# Altium footprint library SMD IC Packages.PcbLib: 345 footprints (part 26 of 36) (continued)
## PG411 [mm] "411-Pin Ceramic Pin Grid Array (PG411)" (continued)
Top Overlay:
  circle w0.25: c-27.1,24.13 r0.125
  lines w0.2: -26.45,-26.45 -26.45,25.45 -25.45,26.45 26.45,26.45 26.45,-26.45 -26.45,-26.45

## PG475 [mm] "475-Pin Ceramic Pin Grid Array (PG475)"
height 5.86
pads (475):
  round 1.5 hole 0.9: A3(-22.86,25.4) A5(-20.32,25.4) A7(-17.78,25.4) A9(-15.24,25.4) A11(-12.7,25.4) A13(-10.16,25.4) A15(-7.62,25.4) A17(-5.08,25.4) A19(-2.54,25.4) A21(0,25.4) A23(2.54,25.4) A25(5.08,25.4) A27(7.62,25.4) A29(10.16,25.4) A31(12.7,25.4) A33(15.24,25.4) A35(17.78,25.4) A37(20.32,25.4) A39(22.86,25.4) A41(25.4,25.4) AA1(-25.4,0) AA3(-22.86,0) AA5(-20.32,0) AA7(-17.78,0) AA35(17.78,0) AA37(20.32,0) AA39(22.86,0) AA41(25.4,0) AB2(-24.13,-1.27) AB4(-21.59,-1.27) AB6(-19.05,-1.27) AB36(19.05,-1.27) AB38(21.59,-1.27) AB40(24.13,-1.27) AC1(-25.4,-2.54) AC3(-22.86,-2.54) AC5(-20.32,-2.54) AC7(-17.78,-2.54) AC35(17.78,-2.54) AC37(20.32,-2.54) AC39(22.86,-2.54) AC41(25.4,-2.54) AD2(-24.13,-3.81) AD4(-21.59,-3.81) AD6(-19.05,-3.81) AD36(19.05,-3.81) AD38(21.59,-3.81) AD40(24.13,-3.81) AE1(-25.4,-5.08) AE3(-22.86,-5.08) AE5(-20.32,-5.08) AE7(-17.78,-5.08) AE35(17.78,-5.08) AE37(20.32,-5.08) AE39(22.86,-5.08) AE41(25.4,-5.08) AF2(-24.13,-6.35) AF4(-21.59,-6.35) AF6(-19.05,-6.35) AF36(19.05,-6.35) AF38(21.59,-6.35) AF40(24.13,-6.35) AG1(-25.4,-7.62) AG3(-22.86,-7.62) AG5(-20.32,-7.62) AG7(-17.78,-7.62) AG35(17.78,-7.62) AG37(20.32,-7.62) AG39(22.86,-7.62) AG41(25.4,-7.62) AH2(-24.13,-8.89) AH4(-21.59,-8.89) AH6(-19.05,-8.89) AH36(19.05,-8.89) AH38(21.59,-8.89) AH40(24.13,-8.89) AJ1(-25.4,-10.16) AJ3(-22.86,-10.16) AJ5(-20.32,-10.16) AJ7(-17.78,-10.16) AJ35(17.78,-10.16) AJ37(20.32,-10.16) AJ39(22.86,-10.16) AJ41(25.4,-10.16) AK2(-24.13,-11.43) AK4(-21.59,-11.43) AK6(-19.05,-11.43) AK36(19.05,-11.43) AK38(21.59,-11.43) AK40(24.13,-11.43) AL1(-25.4,-12.7) AL3(-22.86,-12.7) AL5(-20.32,-12.7) AL7(-17.78,-12.7) AL35(17.78,-12.7) AL37(20.32,-12.7) AL39(22.86,-12.7) AL41(25.4,-12.7) AM2(-24.13,-13.97) AM4(-21.59,-13.97) AM6(-19.05,-13.97) AM36(19.05,-13.97) AM38(21.59,-13.97) AM40(24.13,-13.97) AN1(-25.4,-15.24) AN3(-22.86,-15.24) AN5(-20.32,-15.24) AN7(-17.78,-15.24) AN35(17.78,-15.24) AN37(20.32,-15.24) AN39(22.86,-15.24) AN41(25.4,-15.24) AP2(-24.13,-16.51) AP4(-21.59,-16.51) AP6(-19.05,-16.51) AP36(19.05,-16.51) AP38(21.59,-16.51) AP40(24.13,-16.51) AR1(-25.4,-17.78) AR3(-22.86,-17.78) AR5(-20.32,-17.78) AR7(-17.78,-17.78) AR9(-15.24,-17.78) AR11(-12.7,-17.78) AR13(-10.16,-17.78) AR15(-7.62,-17.78) AR17(-5.08,-17.78) AR19(-2.54,-17.78) AR21(0,-17.78) AR23(2.54,-17.78) AR25(5.08,-17.78) AR27(7.62,-17.78) AR29(10.16,-17.78) AR31(12.7,-17.78) AR33(15.24,-17.78) AR35(17.78,-17.78) AR37(20.32,-17.78) AR39(22.86,-17.78) AR41(25.4,-17.78) AT2(-24.13,-19.05) AT4(-21.59,-19.05) AT6(-19.05,-19.05) AT8(-16.51,-19.05) AT10(-13.97,-19.05) AT12(-11.43,-19.05) AT14(-8.89,-19.05) AT16(-6.35,-19.05) AT18(-3.81,-19.05) AT20(-1.27,-19.05) AT22(1.27,-19.05) AT24(3.81,-19.05) AT26(6.35,-19.05) AT28(8.89,-19.05) AT30(11.43,-19.05) AT32(13.97,-19.05) AT34(16.51,-19.05) AT36(19.05,-19.05) AT38(21.59,-19.05) AT40(24.13,-19.05) AU1(-25.4,-20.32) AU3(-22.86,-20.32) AU5(-20.32,-20.32) AU7(-17.78,-20.32) AU9(-15.24,-20.32) AU11(-12.7,-20.32) AU13(-10.16,-20.32) AU15(-7.62,-20.32) AU17(-5.08,-20.32) AU19(-2.54,-20.32) AU21(0,-20.32) AU23(2.54,-20.32) AU25(5.08,-20.32) AU27(7.62,-20.32) AU29(10.16,-20.32) AU31(12.7,-20.32) AU33(15.24,-20.32) AU35(17.78,-20.32) AU37(20.32,-20.32) AU39(22.86,-20.32) AU41(25.4,-20.32) AV2(-24.13,-21.59) AV4(-21.59,-21.59) AV6(-19.05,-21.59) AV8(-16.51,-21.59) AV10(-13.97,-21.59) AV12(-11.43,-21.59) AV14(-8.89,-21.59) AV16(-6.35,-21.59) AV18(-3.81,-21.59) AV20(-1.27,-21.59) AV22(1.27,-21.59) AV24(3.81,-21.59) AV26(6.35,-21.59) AV28(8.89,-21.59) AV30(11.43,-21.59) AV32(13.97,-21.59) AV34(16.51,-21.59) AV36(19.05,-21.59) AV38(21.59,-21.59) AV40(24.13,-21.59) AW1(-25.4,-22.86) AW3(-22.86,-22.86) AW5(-20.32,-22.86) AW7(-17.78,-22.86) AW9(-15.24,-22.86) AW11(-12.7,-22.86) AW13(-10.16,-22.86) AW15(-7.62,-22.86) AW17(-5.08,-22.86) AW19(-2.54,-22.86) AW21(0,-22.86) AW23(2.54,-22.86) AW25(5.08,-22.86) AW27(7.62,-22.86) AW29(10.16,-22.86) AW31(12.7,-22.86) AW33(15.24,-22.86) AW35(17.78,-22.86) AW37(20.32,-22.86) AW39(22.86,-22.86) AW41(25.4,-22.86) AY2(-24.13,-24.13) AY4(-21.59,-24.13) AY6(-19.05,-24.13) AY8(-16.51,-24.13) AY10(-13.97,-24.13) AY12(-11.43,-24.13) AY14(-8.89,-24.13) AY16(-6.35,-24.13) AY18(-3.81,-24.13) AY20(-1.27,-24.13) AY22(1.27,-24.13) AY24(3.81,-24.13) AY26(6.35,-24.13) AY28(8.89,-24.13) AY30(11.43,-24.13) AY32(13.97,-24.13) AY34(16.51,-24.13) AY36(19.05,-24.13) AY38(21.59,-24.13) AY40(24.13,-24.13) B2(-24.13,24.13) B4(-21.59,24.13) B6(-19.05,24.13) B8(-16.51,24.13) B10(-13.97,24.13) B12(-11.43,24.13) B14(-8.89,24.13) B16(-6.35,24.13) B18(-3.81,24.13) B20(-1.27,24.13) B22(1.27,24.13) B24(3.81,24.13) B26(6.35,24.13) B28(8.89,24.13) B30(11.43,24.13) B32(13.97,24.13) B34(16.51,24.13) B36(19.05,24.13) B38(21.59,24.13) B40(24.13,24.13) BA1(-25.4,-25.4) BA3(-22.86,-25.4) BA5(-20.32,-25.4) BA7(-17.78,-25.4) BA9(-15.24,-25.4) BA11(-12.7,-25.4) BA13(-10.16,-25.4) BA15(-7.62,-25.4) BA17(-5.08,-25.4) BA19(-2.54,-25.4) BA21(0,-25.4) BA23(2.54,-25.4) BA25(5.08,-25.4) BA27(7.62,-25.4) BA29(10.16,-25.4) BA31(12.7,-25.4) BA33(15.24,-25.4) BA35(17.78,-25.4) BA37(20.32,-25.4) BA39(22.86,-25.4) BA41(25.4,-25.4) C1(-25.4,22.86) C3(-22.86,22.86) C5(-20.32,22.86) C7(-17.78,22.86) C9(-15.24,22.86) C11(-12.7,22.86) C13(-10.16,22.86) C15(-7.62,22.86) C17(-5.08,22.86) C19(-2.54,22.86) C21(0,22.86) C23(2.54,22.86) C25(5.08,22.86) C27(7.62,22.86) C29(10.16,22.86) C31(12.7,22.86) C33(15.24,22.86) C35(17.78,22.86) C37(20.32,22.86) C39(22.86,22.86) C41(25.4,22.86) D2(-24.13,21.59) D4(-21.59,21.59) D6(-19.05,21.59) D8(-16.51,21.59) D10(-13.97,21.59) D12(-11.43,21.59) D14(-8.89,21.59) D16(-6.35,21.59) D18(-3.81,21.59) D20(-1.27,21.59) D22(1.27,21.59) D24(3.81,21.59) D26(6.35,21.59) D28(8.89,21.59) D30(11.43,21.59) D32(13.97,21.59) D34(16.51,21.59) D36(19.05,21.59) D38(21.59,21.59) D40(24.13,21.59) E1(-25.4,20.32) E3(-22.86,20.32) E5(-20.32,20.32) E7(-17.78,20.32) E9(-15.24,20.32) E11(-12.7,20.32) E13(-10.16,20.32) E15(-7.62,20.32) E17(-5.08,20.32) E19(-2.54,20.32) E21(0,20.32) E23(2.54,20.32) E25(5.08,20.32) E27(7.62,20.32) E29(10.16,20.32) E31(12.7,20.32) E33(15.24,20.32) E35(17.78,20.32) E37(20.32,20.32) E39(22.86,20.32) E41(25.4,20.32) F2(-24.13,19.05) F4(-21.59,19.05) F6(-19.05,19.05) F8(-16.51,19.05) F10(-13.97,19.05) F12(-11.43,19.05) F14(-8.89,19.05) F16(-6.35,19.05) F18(-3.81,19.05) F20(-1.27,19.05) F22(1.27,19.05) F24(3.81,19.05) F26(6.35,19.05) F28(8.89,19.05) F30(11.43,19.05) F32(13.97,19.05) F34(16.51,19.05) F36(19.05,19.05) F38(21.59,19.05) F40(24.13,19.05) G1(-25.4,17.78) G3(-22.86,17.78) G5(-20.32,17.78) G7(-17.78,17.78) G9(-15.24,17.78) G11(-12.7,17.78) G13(-10.16,17.78) G15(-7.62,17.78) G17(-5.08,17.78) G19(-2.54,17.78) G21(0,17.78) G23(2.54,17.78) G25(5.08,17.78) G27(7.62,17.78) G29(10.16,17.78) G31(12.7,17.78) G33(15.24,17.78) G35(17.78,17.78) G37(20.32,17.78) G39(22.86,17.78) G41(25.4,17.78) H2(-24.13,16.51) H4(-21.59,16.51) H6(-19.05,16.51) H36(19.05,16.51) H38(21.59,16.51) H40(24.13,16.51) J1(-25.4,15.24) J3(-22.86,15.24) J5(-20.32,15.24) J7(-17.78,15.24) J35(17.78,15.24) J37(20.32,15.24) J39(22.86,15.24) J41(25.4,15.24) K2(-24.13,13.97) K4(-21.59,13.97) K6(-19.05,13.97) K36(19.05,13.97) K38(21.59,13.97) K40(24.13,13.97) L1(-25.4,12.7) L3(-22.86,12.7) L5(-20.32,12.7) L7(-17.78,12.7) L35(17.78,12.7) L37(20.32,12.7) L39(22.86,12.7) L41(25.4,12.7) M2(-24.13,11.43) M4(-21.59,11.43) M6(-19.05,11.43) M36(19.05,11.43) M38(21.59,11.43) M40(24.13,11.43) N1(-25.4,10.16) N3(-22.86,10.16) N5(-20.32,10.16) N7(-17.78,10.16) N35(17.78,10.16) N37(20.32,10.16) N39(22.86,10.16) N41(25.4,10.16) P2(-24.13,8.89) P4(-21.59,8.89) P6(-19.05,8.89) P36(19.05,8.89) P38(21.59,8.89) P40(24.13,8.89) R1(-25.4,7.62) R3(-22.86,7.62) R5(-20.32,7.62) R7(-17.78,7.62) R35(17.78,7.62) R37(20.32,7.62) R39(22.86,7.62) R41(25.4,7.62) T2(-24.13,6.35) T4(-21.59,6.35) T6(-19.05,6.35) T36(19.05,6.35) T38(21.59,6.35) T40(24.13,6.35) U1(-25.4,5.08) U3(-22.86,5.08) U5(-20.32,5.08) U7(-17.78,5.08) U35(17.78,5.08) U37(20.32,5.08) U39(22.86,5.08) U41(25.4,5.08) V2(-24.13,3.81) V4(-21.59,3.81) V6(-19.05,3.81) V36(19.05,3.81) V38(21.59,3.81) V40(24.13,3.81) W1(-25.4,2.54) W3(-22.86,2.54) W5(-20.32,2.54) W7(-17.78,2.54) W35(17.78,2.54) W37(20.32,2.54) W39(22.86,2.54) W41(25.4,2.54) Y2(-24.13,1.27) Y4(-21.59,1.27) Y6(-19.05,1.27) Y36(19.05,1.27) Y38(21.59,1.27) Y40(24.13,1.27)
Top Overlay:
  circle w0.25: c-28.35,25.4 r0.125
  lines w0.2: -27.7,-27.7 27.7,-27.7 27.7,27.7 -26.7,27.7 -27.7,26.7 -27.7,-27.7

## PG559 [mm] "559-Pin Ceramic Pin Grid Array (PG559)"
height 5.86
pads (559):
  round 1.5 hole 0.9: A3(-24.13,26.67) A5(-21.59,26.67) A7(-19.05,26.67) A9(-16.51,26.67) A11(-13.97,26.67) A13(-11.43,26.67) A15(-8.89,26.67) A17(-6.35,26.67) A19(-3.81,26.67) A21(-1.27,26.67) A23(1.27,26.67) A25(3.81,26.67) A27(6.35,26.67) A29(8.89,26.67) A31(11.43,26.67) A33(13.97,26.67) A35(16.51,26.67) A37(19.05,26.67) A39(21.59,26.67) A41(24.13,26.67) A43(26.67,26.67) AA1(-26.67,1.27) AA3(-24.13,1.27) AA5(-21.59,1.27) AA7(-19.05,1.27) AA37(19.05,1.27) AA39(21.59,1.27) AA41(24.13,1.27) AA43(26.67,1.27) AB2(-25.4,0) AB4(-22.86,0) AB6(-20.32,0) AB8(-17.78,0) AB36(17.78,0) AB38(20.32,0) AB40(22.86,0) AB42(25.4,0) AC1(-26.67,-1.27) AC3(-24.13,-1.27) AC5(-21.59,-1.27) AC7(-19.05,-1.27) AC37(19.05,-1.27) AC39(21.59,-1.27) AC41(24.13,-1.27) AC43(26.67,-1.27) AD2(-25.4,-2.54) AD4(-22.86,-2.54) AD6(-20.32,-2.54) AD8(-17.78,-2.54) AD36(17.78,-2.54) AD38(20.32,-2.54) AD40(22.86,-2.54) AD42(25.4,-2.54) AE1(-26.67,-3.81) AE3(-24.13,-3.81) AE5(-21.59,-3.81) AE7(-19.05,-3.81) AE37(19.05,-3.81) AE39(21.59,-3.81) AE41(24.13,-3.81) AE43(26.67,-3.81) AF2(-25.4,-5.08) AF4(-22.86,-5.08) AF6(-20.32,-5.08) AF8(-17.78,-5.08) AF36(17.78,-5.08) AF38(20.32,-5.08) AF40(22.86,-5.08) AF42(25.4,-5.08) AG1(-26.67,-6.35) AG3(-24.13,-6.35) AG5(-21.59,-6.35) AG7(-19.05,-6.35) AG37(19.05,-6.35) AG39(21.59,-6.35) AG41(24.13,-6.35) AG43(26.67,-6.35) AH2(-25.4,-7.62) AH4(-22.86,-7.62) AH6(-20.32,-7.62) AH8(-17.78,-7.62) AH36(17.78,-7.62) AH38(20.32,-7.62) AH40(22.86,-7.62) AH42(25.4,-7.62) AJ1(-26.67,-8.89) AJ3(-24.13,-8.89) AJ5(-21.59,-8.89) AJ7(-19.05,-8.89) AJ37(19.05,-8.89) AJ39(21.59,-8.89) AJ41(24.13,-8.89) AJ43(26.67,-8.89) AK2(-25.4,-10.16) AK4(-22.86,-10.16) AK6(-20.32,-10.16) AK8(-17.78,-10.16) AK36(17.78,-10.16) AK38(20.32,-10.16) AK40(22.86,-10.16) AK42(25.4,-10.16) AL1(-26.67,-11.43) AL3(-24.13,-11.43) AL5(-21.59,-11.43) AL7(-19.05,-11.43) AL37(19.05,-11.43) AL39(21.59,-11.43) AL41(24.13,-11.43) AL43(26.67,-11.43) AM2(-25.4,-12.7) AM4(-22.86,-12.7) AM6(-20.32,-12.7) AM8(-17.78,-12.7) AM36(17.78,-12.7) AM38(20.32,-12.7) AM40(22.86,-12.7) AM42(25.4,-12.7) AN1(-26.67,-13.97) AN3(-24.13,-13.97) AN5(-21.59,-13.97) AN7(-19.05,-13.97) AN37(19.05,-13.97) AN39(21.59,-13.97) AN41(24.13,-13.97) AN43(26.67,-13.97) AP2(-25.4,-15.24) AP4(-22.86,-15.24) AP6(-20.32,-15.24) AP8(-17.78,-15.24) AP36(17.78,-15.24) AP38(20.32,-15.24) AP40(22.86,-15.24) AP42(25.4,-15.24) AR1(-26.67,-16.51) AR3(-24.13,-16.51) AR5(-21.59,-16.51) AR7(-19.05,-16.51) AR37(19.05,-16.51) AR39(21.59,-16.51) AR41(24.13,-16.51) AR43(26.67,-16.51) AT2(-25.4,-17.78) AT4(-22.86,-17.78) AT6(-20.32,-17.78) AT8(-17.78,-17.78) AT10(-15.24,-17.78) AT12(-12.7,-17.78) AT14(-10.16,-17.78) AT16(-7.62,-17.78) AT18(-5.08,-17.78) AT20(-2.54,-17.78) AT22(0,-17.78) AT24(2.54,-17.78) AT26(5.08,-17.78) AT28(7.62,-17.78) AT30(10.16,-17.78) AT32(12.7,-17.78) AT34(15.24,-17.78) AT36(17.78,-17.78) AT38(20.32,-17.78) AT40(22.86,-17.78) AT42(25.4,-17.78) AU1(-26.67,-19.05) AU3(-24.13,-19.05) AU5(-21.59,-19.05) AU7(-19.05,-19.05) AU9(-16.51,-19.05) AU11(-13.97,-19.05) AU13(-11.43,-19.05) AU15(-8.89,-19.05) AU17(-6.35,-19.05) AU19(-3.81,-19.05) AU21(-1.27,-19.05) AU23(1.27,-19.05) AU25(3.81,-19.05) AU27(6.35,-19.05) AU29(8.89,-19.05) AU31(11.43,-19.05) AU33(13.97,-19.05) AU35(16.51,-19.05) AU37(19.05,-19.05) AU39(21.59,-19.05) AU41(24.13,-19.05) AU43(26.67,-19.05) AV2(-25.4,-20.32) AV4(-22.86,-20.32) AV6(-20.32,-20.32) AV8(-17.78,-20.32) AV10(-15.24,-20.32) AV12(-12.7,-20.32) AV14(-10.16,-20.32) AV16(-7.62,-20.32) AV18(-5.08,-20.32) AV20(-2.54,-20.32) AV22(0,-20.32) AV24(2.54,-20.32) AV26(5.08,-20.32) AV28(7.62,-20.32) AV30(10.16,-20.32) AV32(12.7,-20.32) AV34(15.24,-20.32) AV36(17.78,-20.32) AV38(20.32,-20.32) AV40(22.86,-20.32) AV42(25.4,-20.32) AW1(-26.67,-21.59) AW3(-24.13,-21.59) AW5(-21.59,-21.59) AW7(-19.05,-21.59) AW9(-16.51,-21.59) AW11(-13.97,-21.59) AW13(-11.43,-21.59) AW15(-8.89,-21.59) AW17(-6.35,-21.59) AW19(-3.81,-21.59) AW21(-1.27,-21.59) AW23(1.27,-21.59) AW25(3.81,-21.59) AW27(6.35,-21.59) AW29(8.89,-21.59) AW31(11.43,-21.59) AW33(13.97,-21.59) AW35(16.51,-21.59) AW37(19.05,-21.59) AW39(21.59,-21.59) AW41(24.13,-21.59) AW43(26.67,-21.59) AY2(-25.4,-22.86) AY4(-22.86,-22.86) AY6(-20.32,-22.86) AY8(-17.78,-22.86) AY10(-15.24,-22.86) AY12(-12.7,-22.86) AY14(-10.16,-22.86) AY16(-7.62,-22.86) AY18(-5.08,-22.86) AY20(-2.54,-22.86) AY22(0,-22.86) AY24(2.54,-22.86) AY26(5.08,-22.86) AY28(7.62,-22.86) AY30(10.16,-22.86) AY32(12.7,-22.86) AY34(15.24,-22.86) AY36(17.78,-22.86) AY38(20.32,-22.86) AY40(22.86,-22.86) AY42(25.4,-22.86) B2(-25.4,25.4) B4(-22.86,25.4) B6(-20.32,25.4) B8(-17.78,25.4) B10(-15.24,25.4) B12(-12.7,25.4) B14(-10.16,25.4) B16(-7.62,25.4) B18(-5.08,25.4) B20(-2.54,25.4) B22(0,25.4) B24(2.54,25.4) B26(5.08,25.4) B28(7.62,25.4) B30(10.16,25.4) B32(12.7,25.4) B34(15.24,25.4) B36(17.78,25.4) B38(20.32,25.4) B40(22.86,25.4) B42(25.4,25.4) BA1(-26.67,-24.13) BA3(-24.13,-24.13) BA5(-21.59,-24.13) BA7(-19.05,-24.13) BA9(-16.51,-24.13) BA11(-13.97,-24.13) BA13(-11.43,-24.13) BA15(-8.89,-24.13) BA17(-6.35,-24.13) BA19(-3.81,-24.13) BA21(-1.27,-24.13) BA23(1.27,-24.13) BA25(3.81,-24.13) BA27(6.35,-24.13) BA29(8.89,-24.13) BA31(11.43,-24.13) BA33(13.97,-24.13) BA35(16.51,-24.13) BA37(19.05,-24.13) BA39(21.59,-24.13) BA41(24.13,-24.13) BA43(26.67,-24.13) BB2(-25.4,-25.4) BB4(-22.86,-25.4) BB6(-20.32,-25.4) BB8(-17.78,-25.4) BB10(-15.24,-25.4) BB12(-12.7,-25.4) BB14(-10.16,-25.4) BB16(-7.62,-25.4) BB18(-5.08,-25.4) BB20(-2.54,-25.4) BB22(0,-25.4) BB24(2.54,-25.4) BB26(5.08,-25.4) BB28(7.62,-25.4) BB30(10.16,-25.4) BB32(12.7,-25.4) BB34(15.24,-25.4) BB36(17.78,-25.4) BB38(20.32,-25.4) BB40(22.86,-25.4) BB42(25.4,-25.4) BC1(-26.67,-26.67) BC3(-24.13,-26.67) BC5(-21.59,-26.67) BC7(-19.05,-26.67) BC9(-16.51,-26.67) BC11(-13.97,-26.67) BC13(-11.43,-26.67) BC15(-8.89,-26.67) BC17(-6.35,-26.67) BC19(-3.81,-26.67) BC21(-1.27,-26.67) BC23(1.27,-26.67) BC25(3.81,-26.67) BC27(6.35,-26.67) BC29(8.89,-26.67) BC31(11.43,-26.67) BC33(13.97,-26.67) BC35(16.51,-26.67) BC37(19.05,-26.67) BC39(21.59,-26.67) BC41(24.13,-26.67) BC43(26.67,-26.67) C1(-26.67,24.13) C3(-24.13,24.13) C5(-21.59,24.13) C7(-19.05,24.13) C9(-16.51,24.13) C11(-13.97,24.13) C13(-11.43,24.13) C15(-8.89,24.13) C17(-6.35,24.13) C19(-3.81,24.13) C21(-1.27,24.13) C23(1.27,24.13) C25(3.81,24.13) C27(6.35,24.13) C29(8.89,24.13) C31(11.43,24.13) C33(13.97,24.13) C35(16.51,24.13) C37(19.05,24.13) C39(21.59,24.13) C41(24.13,24.13) C43(26.67,24.13) D2(-25.4,22.86) D4(-22.86,22.86) D6(-20.32,22.86) D8(-17.78,22.86) D10(-15.24,22.86) D12(-12.7,22.86) D14(-10.16,22.86) D16(-7.62,22.86) D18(-5.08,22.86) D20(-2.54,22.86) D22(0,22.86) D24(2.54,22.86) D26(5.08,22.86) D28(7.62,22.86) D30(10.16,22.86) D32(12.7,22.86) D34(15.24,22.86) D36(17.78,22.86) D38(20.32,22.86) D40(22.86,22.86) D42(25.4,22.86) E1(-26.67,21.59) E3(-24.13,21.59) E5(-21.59,21.59) E7(-19.05,21.59) E9(-16.51,21.59) E11(-13.97,21.59) E13(-11.43,21.59) E15(-8.89,21.59) E17(-6.35,21.59) E19(-3.81,21.59) E21(-1.27,21.59) E23(1.27,21.59) E25(3.81,21.59) E27(6.35,21.59) E29(8.89,21.59) E31(11.43,21.59) E33(13.97,21.59) E35(16.51,21.59) E37(19.05,21.59) E39(21.59,21.59) E41(24.13,21.59) E43(26.67,21.59) F2(-25.4,20.32) F4(-22.86,20.32) F6(-20.32,20.32) F8(-17.78,20.32) F10(-15.24,20.32) F12(-12.7,20.32) F14(-10.16,20.32) F16(-7.62,20.32) F18(-5.08,20.32) F20(-2.54,20.32) F22(0,20.32) F24(2.54,20.32) F26(5.08,20.32) F28(7.62,20.32) F30(10.16,20.32) F32(12.7,20.32) F34(15.24,20.32) F36(17.78,20.32) F38(20.32,20.32) F40(22.86,20.32) F42(25.4,20.32) G1(-26.67,19.05) G3(-24.13,19.05) G5(-21.59,19.05) G7(-19.05,19.05) G9(-16.51,19.05) G11(-13.97,19.05) G13(-11.43,19.05) G15(-8.89,19.05) G17(-6.35,19.05) G19(-3.81,19.05) G21(-1.27,19.05) G23(1.27,19.05) G25(3.81,19.05) G27(6.35,19.05) G29(8.89,19.05) G31(11.43,19.05) G33(13.97,19.05) G35(16.51,19.05) G37(19.05,19.05) G39(21.59,19.05) G41(24.13,19.05) G43(26.67,19.05) H2(-25.4,17.78) H4(-22.86,17.78) H6(-20.32,17.78) H8(-17.78,17.78) H10(-15.24,17.78) H12(-12.7,17.78) H14(-10.16,17.78) H16(-7.62,17.78) H18(-5.08,17.78) H20(-2.54,17.78) H22(0,17.78) H24(2.54,17.78) H26(5.08,17.78) H28(7.62,17.78) H30(10.16,17.78) H32(12.7,17.78) H34(15.24,17.78) H36(17.78,17.78) H38(20.32,17.78) H40(22.86,17.78) H42(25.4,17.78) J1(-26.67,16.51) J3(-24.13,16.51) J5(-21.59,16.51) J7(-19.05,16.51) J37(19.05,16.51) J39(21.59,16.51) J41(24.13,16.51) J43(26.67,16.51) K2(-25.4,15.24) K4(-22.86,15.24) K6(-20.32,15.24) K8(-17.78,15.24) K36(17.78,15.24) K38(20.32,15.24) K40(22.86,15.24) K42(25.4,15.24) L1(-26.67,13.97) L3(-24.13,13.97) L5(-21.59,13.97) L7(-19.05,13.97) L37(19.05,13.97) L39(21.59,13.97) L41(24.13,13.97) L43(26.67,13.97) M2(-25.4,12.7) M4(-22.86,12.7) M6(-20.32,12.7) M8(-17.78,12.7) M36(17.78,12.7) M38(20.32,12.7) M40(22.86,12.7) M42(25.4,12.7) N1(-26.67,11.43) N3(-24.13,11.43) N5(-21.59,11.43) N7(-19.05,11.43) N37(19.05,11.43) N39(21.59,11.43) N41(24.13,11.43) N43(26.67,11.43) P2(-25.4,10.16) P4(-22.86,10.16) P6(-20.32,10.16) P8(-17.78,10.16) P36(17.78,10.16) P38(20.32,10.16) P40(22.86,10.16) P42(25.4,10.16) R1(-26.67,8.89) R3(-24.13,8.89) R5(-21.59,8.89) R7(-19.05,8.89) R37(19.05,8.89) R39(21.59,8.89) R41(24.13,8.89) R43(26.67,8.89) T2(-25.4,7.62) T4(-22.86,7.62) T6(-20.32,7.62) T8(-17.78,7.62) T36(17.78,7.62) T38(20.32,7.62) T40(22.86,7.62) T42(25.4,7.62) U1(-26.67,6.35) U3(-24.13,6.35) U5(-21.59,6.35) U7(-19.05,6.35) U37(19.05,6.35) U39(21.59,6.35) U41(24.13,6.35) U43(26.67,6.35) V2(-25.4,5.08) V4(-22.86,5.08) V6(-20.32,5.08) V8(-17.78,5.08) V36(17.78,5.08) V38(20.32,5.08) V40(22.86,5.08) V42(25.4,5.08) W1(-26.67,3.81) W3(-24.13,3.81) W5(-21.59,3.81) W7(-19.05,3.81) W37(19.05,3.81) W39(21.59,3.81) W41(24.13,3.81) W43(26.67,3.81) Y2(-25.4,2.54) Y4(-22.86,2.54) Y6(-20.32,2.54) Y8(-17.78,2.54) Y36(17.78,2.54) Y38(20.32,2.54) Y40(22.86,2.54) Y42(25.4,2.54)
Top Overlay:
  circle w0.25: c-29.65,26.67 r0.125
  lines w0.2: -29,-29 -29,28 -28,29 29,29 29,-29 -29,-29

## PP132 [mm] "132-Pin Plastic Pin Grid Array (PP132)"
height 4.191
pads (132):
  rect 1.5x1.5 hole 0.9: A1(-16.51,16.51)
  round 1.5 hole 0.9: A2(-13.97,16.51) A3(-11.43,16.51) A4(-8.89,16.51) A5(-6.35,16.51) A6(-3.81,16.51) A7(-1.27,16.51) A8(1.27,16.51) A9(3.81,16.51) A10(6.35,16.51) A11(8.89,16.51) A12(11.43,16.51) A13(13.97,16.51) A14(16.51,16.51) B1(-16.51,13.97) B2(-13.97,13.97) B3(-11.43,13.97) B4(-8.89,13.97) B5(-6.35,13.97) B6(-3.81,13.97) B7(-1.27,13.97) B8(1.27,13.97) B9(3.81,13.97) B10(6.35,13.97) B11(8.89,13.97) B12(11.43,13.97) B13(13.97,13.97) B14(16.51,13.97) C1(-16.51,11.43) C2(-13.97,11.43) C3(-11.43,11.43) C4(-8.89,11.43) C5(-6.35,11.43) C6(-3.81,11.43) C7(-1.27,11.43) C8(1.27,11.43) C9(3.81,11.43) C10(6.35,11.43) C11(8.89,11.43) C12(11.43,11.43) C13(13.97,11.43) C14(16.51,11.43) D1(-16.51,8.89) D2(-13.97,8.89) D3(-11.43,8.89) D12(11.43,8.89) D13(13.97,8.89) D14(16.51,8.89) E1(-16.51,6.35) E2(-13.97,6.35) E3(-11.43,6.35) E12(11.43,6.35) E13(13.97,6.35) E14(16.51,6.35) F1(-16.51,3.81) F2(-13.97,3.81) F3(-11.43,3.81) F12(11.43,3.81) F13(13.97,3.81) F14(16.51,3.81) G1(-16.51,1.27) G2(-13.97,1.27) G3(-11.43,1.27) G12(11.43,1.27) G13(13.97,1.27) G14(16.51,1.27) H1(-16.51,-1.27) H2(-13.97,-1.27) H3(-11.43,-1.27) H12(11.43,-1.27) H13(13.97,-1.27) H14(16.51,-1.27) J1(-16.51,-3.81) J2(-13.97,-3.81) J3(-11.43,-3.81) J12(11.43,-3.81) J13(13.97,-3.81) J14(16.51,-3.81) K1(-16.51,-6.35) K2(-13.97,-6.35) K3(-11.43,-6.35) K12(11.43,-6.35) K13(13.97,-6.35) K14(16.51,-6.35) L1(-16.51,-8.89) L2(-13.97,-8.89) L3(-11.43,-8.89) L12(11.43,-8.89) L13(13.97,-8.89) L14(16.51,-8.89) M1(-16.51,-11.43) M2(-13.97,-11.43) M3(-11.43,-11.43) M4(-8.89,-11.43) M5(-6.35,-11.43) M6(-3.81,-11.43) M7(-1.27,-11.43) M8(1.27,-11.43) M9(3.81,-11.43) M10(6.35,-11.43) M11(8.89,-11.43) M12(11.43,-11.43) M13(13.97,-11.43) M14(16.51,-11.43) N1(-16.51,-13.97) N2(-13.97,-13.97) N3(-11.43,-13.97) N4(-8.89,-13.97) N5(-6.35,-13.97) N6(-3.81,-13.97) N7(-1.27,-13.97) N8(1.27,-13.97) N9(3.81,-13.97) N10(6.35,-13.97) N11(8.89,-13.97) N12(11.43,-13.97) N13(13.97,-13.97) N14(16.51,-13.97) P1(-16.51,-16.51) P2(-13.97,-16.51) P3(-11.43,-16.51) P4(-8.89,-16.51) P5(-6.35,-16.51) P6(-3.81,-16.51) P7(-1.27,-16.51) P8(1.27,-16.51) P9(3.81,-16.51) P10(6.35,-16.51) P11(8.89,-16.51) P12(11.43,-16.51) P13(13.97,-16.51) P14(16.51,-16.51)
Top Overlay:
  circle w0.25: c-19.4,16.51 r0.125
  lines w0.2: -18.75,-18.75 -18.75,17.75 -17.75,18.75 18.75,18.75 18.75,-18.75 -18.75,-18.75

## PP175 [mm] "175-Pin Plastic Pin Grid Array (PP175)"
height 4.191
pads (175):
  round 1.5 hole 0.9: A2(-16.51,19.05) A3(-13.97,19.05) A4(-11.43,19.05) A5(-8.89,19.05) A6(-6.35,19.05) A7(-3.81,19.05) A8(-1.27,19.05) A9(1.27,19.05) A10(3.81,19.05) A11(6.35,19.05) A12(8.89,19.05) A13(11.43,19.05) A14(13.97,19.05) A15(16.51,19.05) A16(19.05,19.05) B1(-19.05,16.51) B2(-16.51,16.51) B3(-13.97,16.51) B4(-11.43,16.51) B5(-8.89,16.51) B6(-6.35,16.51) B7(-3.81,16.51) B8(-1.27,16.51) B9(1.27,16.51) B10(3.81,16.51) B11(6.35,16.51) B12(8.89,16.51) B13(11.43,16.51) B14(13.97,16.51) B15(16.51,16.51) B16(19.05,16.51) C1(-19.05,13.97) C2(-16.51,13.97) C3(-13.97,13.97) C4(-11.43,13.97) C5(-8.89,13.97) C6(-6.35,13.97) C7(-3.81,13.97) C8(-1.27,13.97) C9(1.27,13.97) C10(3.81,13.97) C11(6.35,13.97) C12(8.89,13.97) C13(11.43,13.97) C14(13.97,13.97) C15(16.51,13.97) C16(19.05,13.97) D1(-19.05,11.43) D2(-16.51,11.43) D3(-13.97,11.43) D4(-11.43,11.43) D5(-8.89,11.43) D6(-6.35,11.43) D7(-3.81,11.43) D8(-1.27,11.43) D9(1.27,11.43) D10(3.81,11.43) D11(6.35,11.43) D12(8.89,11.43) D13(11.43,11.43) D14(13.97,11.43) D15(16.51,11.43) D16(19.05,11.43) E1(-19.05,8.89) E2(-16.51,8.89) E3(-13.97,8.89) E14(13.97,8.89) E15(16.51,8.89) E16(19.05,8.89) F1(-19.05,6.35) F2(-16.51,6.35) F3(-13.97,6.35) F14(13.97,6.35) F15(16.51,6.35) F16(19.05,6.35) G1(-19.05,3.81) G2(-16.51,3.81) G3(-13.97,3.81) G14(13.97,3.81) G15(16.51,3.81) G16(19.05,3.81) H1(-19.05,1.27) H2(-16.51,1.27) H3(-13.97,1.27) H14(13.97,1.27) H15(16.51,1.27) H16(19.05,1.27) J1(-19.05,-1.27) J2(-16.51,-1.27) J3(-13.97,-1.27) J14(13.97,-1.27) J15(16.51,-1.27) J16(19.05,-1.27) K1(-19.05,-3.81) K2(-16.51,-3.81) K3(-13.97,-3.81) K14(13.97,-3.81) K15(16.51,-3.81) K16(19.05,-3.81) L1(-19.05,-6.35) L2(-16.51,-6.35) L3(-13.97,-6.35) L14(13.97,-6.35) L15(16.51,-6.35) L16(19.05,-6.35) M1(-19.05,-8.89) M2(-16.51,-8.89) M3(-13.97,-8.89) M14(13.97,-8.89) M15(16.51,-8.89) M16(19.05,-8.89) N1(-19.05,-11.43) N2(-16.51,-11.43) N3(-13.97,-11.43) N4(-11.43,-11.43) N5(-8.89,-11.43) N6(-6.35,-11.43) N7(-3.81,-11.43) N8(-1.27,-11.43) N9(1.27,-11.43) N10(3.81,-11.43) N11(6.35,-11.43) N12(8.89,-11.43) N13(11.43,-11.43) N14(13.97,-11.43) N15(16.51,-11.43) N16(19.05,-11.43) P1(-19.05,-13.97) P2(-16.51,-13.97) P3(-13.97,-13.97) P4(-11.43,-13.97) P5(-8.89,-13.97) P6(-6.35,-13.97) P7(-3.81,-13.97) P8(-1.27,-13.97) P9(1.27,-13.97) P10(3.81,-13.97) P11(6.35,-13.97) P12(8.89,-13.97) P13(11.43,-13.97) P14(13.97,-13.97) P15(16.51,-13.97) P16(19.05,-13.97) R1(-19.05,-16.51) R2(-16.51,-16.51) R3(-13.97,-16.51) R4(-11.43,-16.51) R5(-8.89,-16.51) R6(-6.35,-16.51) R7(-3.81,-16.51) R8(-1.27,-16.51) R9(1.27,-16.51) R10(3.81,-16.51) R11(6.35,-16.51) R12(8.89,-16.51) R13(11.43,-16.51) R14(13.97,-16.51) R15(16.51,-16.51) R16(19.05,-16.51) T1(-19.05,-19.05) T2(-16.51,-19.05) T3(-13.97,-19.05) T4(-11.43,-19.05) T5(-8.89,-19.05) T6(-6.35,-19.05) T7(-3.81,-19.05) T8(-1.27,-19.05) T9(1.27,-19.05) T10(3.81,-19.05) T11(6.35,-19.05) T12(8.89,-19.05) T13(11.43,-19.05) T14(13.97,-19.05) T15(16.51,-19.05) T16(19.05,-19.05)
Top Overlay:
  circle w0.25: c-21.95,19.05 r0.125
  lines w0.2: -21.3,-21.3 21.3,-21.3 21.3,21.3 -20.3,21.3 -21.3,20.3 -21.3,-21.3

## PQ44_L [mm] "44-Pin Plastic Quad Flat Pack (PQ44), IPC High Density"
height 2.35
pads (44):
  oval 1.65x0.55 smd: 1(-6.1,4) 2(-6.1,3.2) 3(-6.1,2.4) 4(-6.1,1.6) 5(-6.1,0.8) 6(-6.1,0) 7(-6.1,-0.8) 8(-6.1,-1.6) 9(-6.1,-2.4) 10(-6.1,-3.2) 11(-6.1,-4) 23(6.1,-4) 24(6.1,-3.2) 25(6.1,-2.4) 26(6.1,-1.6) 27(6.1,-0.8) 28(6.1,0) 29(6.1,0.8) 30(6.1,1.6) 31(6.1,2.4) 32(6.1,3.2) 33(6.1,4)
  oval 0.55x1.65 smd: 12(-4,-6.1) 13(-3.2,-6.1) 14(-2.4,-6.1) 15(-1.6,-6.1) 16(-0.8,-6.1) 17(0,-6.1) 18(0.8,-6.1) 19(1.6,-6.1) 20(2.4,-6.1) 21(3.2,-6.1) 22(4,-6.1) 34(4,6.1) 35(3.2,6.1) 36(2.4,6.1) 37(1.6,6.1) 38(0.8,6.1) 39(0,6.1) 40(-0.8,6.1) 41(-1.6,6.1) 42(-2.4,6.1) 43(-3.2,6.1) 44(-4,6.1)
Top Overlay:
  circle w0.6: c-3.85,3.85 r0.3
  circle w0.25: c-6.1,4.825 r0.125
  lines w0.2: -4.85,-4.85 4.85,-4.85 4.85,4.85 -4.85,4.85 -4.85,-4.85
Mechanical 13:
  circle w0.1: c-4.1,4.1 r0.5
  lines w0.1: -5,-5 5,-5 5,5 -5,5 -5,-5
Mechanical 15:
  lines w0.1: -0.5,0 0.5,0 ; 0,-0.5 0,0.5 ; -7,-7 7,-7 7,7 -7,7 -7,-7
3D body: height 2.35, standoff 0, extent -5,-5 5,5